# Altium footprint library MiscDevices.PcbLib: 251 footprints (part 9 of 16)
Each footprint in its own frame and in the unit in brackets; x right, y up, seen from the top. Pads: shape width x height; smd on the part's side, far side on the other; paste and mask are expansions set on the pad; w line width, h text height; cw(c..) or ccw(c..) is an arc to the next point about the centre after c.
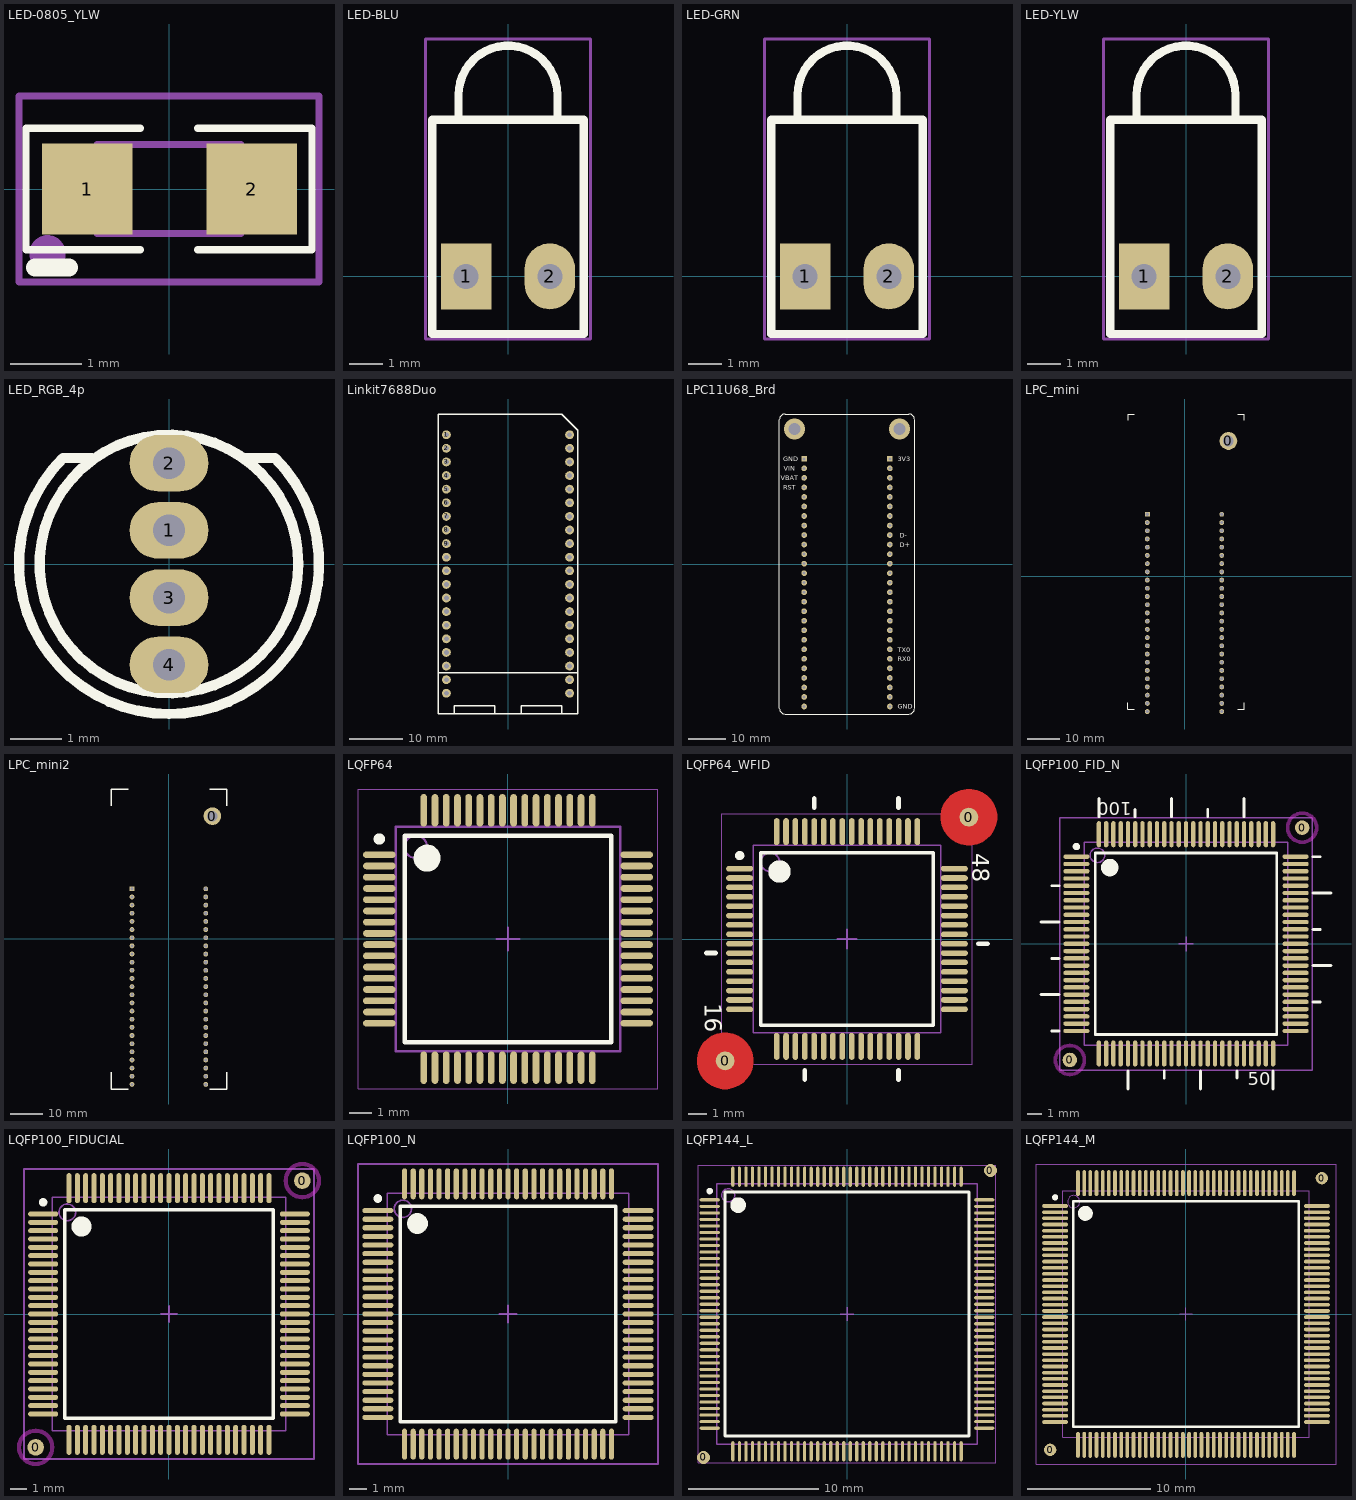
[diagram p8: the footprints below, top view; thin cyan lines are the x and y axes]

## LED-0805_YLW [mil] "Chip LED0805 ; YELLOW"
height 23.62
pads (2):
  rect 50x50 smd: 1(-45,0) 2(45.55,0)
Top Overlay:
  lines w3.94: -15.75,-33.46 -78.74,-33.46 -78.74,33.47 -15.75,33.47 ; 15.75,-33.46 78.74,-33.46 78.74,33.47 15.75,33.47
  lines w10: -73.82,-43.31 -55.12,-43.31
Top Designator (Mech7):
  text ".Designator" at -149.95,-10 h30
Top Assembly:
  lines w3.94: -39.76,-24.6 39.77,-24.6 39.77,24.61 -39.76,24.61 -39.76,-24.6
Top Courtyard:
  circle w10: c-66.93,-35.43 r5
  lines w3.94: -82.68,-51.18 82.68,-51.18 82.68,51.18 -82.68,51.18 -82.68,-51.18
3D body "User Library-User Library-led_0805 YEL.STEP": height 43.31, standoff 0, extent -39.76,-24.61 39.76,24.61

## LED-BLU [mil] "Typical INFRARED GaAs LED; 2 Leads"
pads (2):
  rect 60x78.74 hole 30: 1(-50,0)
  oval 60x78.74 hole 30: 2(50,0)
Top Overlay:
  lines w10: -59.06,187.01 -59.06,216.54 cw(c0,216.54) 59.06,216.54 59.06,187.01 ; -90.55,-68.9 90.55,-68.9 90.55,187.01 -90.55,187.01 -90.55,-68.9
Top Designator (Mech7):
  text ".Designator" at -236.14,82.68 h47.24
Top Courtyard:
  lines w3.94: -98.43,-74.8 98.43,-74.8 98.43,283.46 -98.43,283.46 -98.43,-74.8
3D body "User Library-LEDd3BL.SLDPRT": height 287.9, standoff -97.93, extent -91.79,-75 90.21,269.86

## LED-GRN [mil] "Typical INFRARED GaAs LED; 2 Leads"
pads (2):
  rect 60x78.74 hole 30: 1(-50,0)
  oval 60x78.74 hole 30: 2(50,0)
Top Overlay:
  lines w10: -59.06,187.01 -59.06,216.54 cw(c0,216.54) 59.06,216.54 59.06,187.01 ; -90.55,-68.9 -90.55,187.01 90.55,187.01 90.55,-68.9 -90.55,-68.9
Top Designator (Mech7):
  text ".Designator" at -236.14,82.68 h47.24
Top Courtyard:
  lines w3.94: -98.43,-74.8 -98.43,283.46 98.43,283.46 98.43,-74.8 -98.43,-74.8
3D body "User Library-LEDd3GC.STEP": height 287.9, standoff -97.93, extent -91,-75 91,269.43

## LED-YLW [mil] "Typical INFRARED GaAs LED; 2 Leads"
pads (2):
  rect 60x78.74 hole 30: 1(-50,0)
  oval 60x78.74 hole 30: 2(50,0)
Top Overlay:
  lines w10: -59.06,187.01 -59.06,216.54 cw(c0,216.54) 59.06,216.54 59.06,187.01 ; -90.55,-68.9 90.55,-68.9 90.55,187.01 -90.55,187.01 -90.55,-68.9
Top Designator (Mech7):
  text ".Designator" at -236.14,82.68 h47.24
Top Courtyard:
  lines w3.94: -98.43,-74.8 -98.43,283.46 98.43,283.46 98.43,-74.8 -98.43,-74.8
3D body "User Library-LEDd3YL.SLDPRT": height 287.9, standoff -97.93, extent -92.65,-74 90.45,271.44

## LED_RGB_4p [mil]
pads (4):
  oval 60x43 hole 24: 1(0,25.59) 2(0,76.77) 3(0,-25.59) 4(0,-76.77)
Top Overlay:
  circle w7.87: c0,0 r98.43
  lines w7.87: -59.06,80.73 -80.73,80.73 ccw(c0,0) 80.73,80.73 59.06,80.73
Top Designator (Mech7):
  text ".Designator" at -299.9,-19.99 h60

## Linkit7688Duo [mil] "Board Linkit7688/Linkit7688Duo 40 pin"
height 708.66
pads (40):
  round 65 hole 35: 1(-452.76,950) 2(-452.76,850) 3(-452.76,750) 4(-452.76,650) 5(-452.76,550) 6(-452.76,450) 7(-452.76,350) 8(-452.76,250) 9(-452.76,150) 10(-452.76,50) 11(-452.76,-50) 12(-452.76,-150) 13(-452.76,-250) 14(-452.76,-350) 15(-452.76,-450) 16(-452.76,-550) 17(-452.76,-650) 18(-452.76,-750) 19(-452.76,-850) 20(-452.76,-950) 21(452.76,950) 22(452.76,850) 23(452.76,750) 24(452.76,650) 25(452.76,550) 26(452.76,450) 27(452.76,350) 28(452.76,250) 29(452.76,150) 30(452.76,50) 31(452.76,-50) 32(452.76,-150) 33(452.76,-250) 34(452.76,-350) 35(452.76,-450) 36(452.76,-550) 37(452.76,-650) 38(452.76,-750) 39(452.76,-850) 40(452.76,-950)
Top Overlay:
  lines w10: -511.81,-800 511.81,-800 ; -393.7,-1102.36 -393.7,-1043.31 -98.43,-1043.31 -98.43,-1102.36 ; 98.43,-1102.36 98.43,-1043.31 393.7,-1043.31 393.7,-1102.36 ; -511.81,-1102.36 -511.81,1102.36 393.7,1102.36 511.81,984.25 511.81,-1102.36 -511.81,-1102.36
Top Designator (Mech7):
  text ".Designator" at -299.9,-19.99 h60
3D body "1x20F_HEADER.SLDPRT": height 334.65, standoff -137.8, extent -502.75,-1011.81 -402.75,1011.81
3D body "1x20F_HEADER.SLDPRT": height 334.65, standoff -137.8, extent 402.76,-1011.81 502.76,1011.81

## LPC11U68_Brd [mil]
pads (54):
  rect 60x60 hole 30: 1(-450,1103.94) 28(450,1103.94)
  round 60 hole 30: 2(-450,1003.94) 3(-450,903.94) 4(-450,803.94) 5(-450,703.94) 6(-450,603.94) 7(-450,503.94) 8(-450,403.94) 9(-450,303.94) 10(-450,203.94) 11(-450,103.94) 12(-450,3.94) 13(-450,-96.06) 14(-450,-196.06) 15(-450,-296.06) 16(-450,-396.06) 17(-450,-496.06) 18(-450,-596.06) 19(-450,-696.06) 20(-450,-796.06) 21(-450,-896.06) 22(-450,-996.06) 23(-450,-1096.06) 24(-450,-1196.06) 25(-450,-1296.06) 26(-450,-1396.06) 27(-450,-1496.06) 29(450,1003.94) 30(450,903.94) 31(450,803.94) 32(450,703.94) 33(450,603.94) 34(450,503.94) 35(450,403.94) 36(450,303.94) 37(450,203.94) 38(450,103.94) 39(450,3.94) 40(450,-96.06) 41(450,-196.06) 42(450,-296.06) 43(450,-396.06) 44(450,-496.06) 45(450,-596.06) 46(450,-696.06) 47(450,-796.06) 48(450,-896.06) 49(450,-996.06) 50(450,-1096.06) 51(450,-1196.06) 52(450,-1296.06) 53(450,-1396.06) 54(450,-1496.06)
via 551.18,1417.32 diameter 216.54 hole 129.92
via -551.18,1417.32 diameter 216.54 hole 129.92
Top Overlay:
  lines w10: -708.66,-1515.75 ccw(c-649.61,-1515.75) -649.61,-1574.8 649.61,-1574.8 ccw(c649.61,-1515.75) 708.66,-1515.75 708.66,1515.75 ccw(c649.61,1515.75) 649.61,1574.8 -649.61,1574.8 ccw(c-649.61,1515.75) -708.66,1515.75 -708.66,-1515.75
  text "D-" at 551.18,275.59 h49.21
  text "D+" at 551.18,177.17 h49.21
  text "RX0" at 531.5,-1023.62 h49.21
  text "TX0" at 531.5,-925.2 h49.21
  text "GND" at 531.5,-1520.66 h49.21
  text "3V3" at 531.5,1079.34 h49.21
  text "RST" at -669.29,779.34 h49.21
  text "VBAT" at -693.89,879.34 h49.21
  text "VIN" at -665.19,979.34 h49.21
  text "GND" at -669.29,1079.34 h49.21
Top Designator (Mech7):
  text ".Designator" at -299.9,-19.99 h60
3D body "1x27F_HEADER.SLDPRT": height 334.65, standoff -137.8, extent -500,-1534.25 -400,1165.75
3D body "1x27F_HEADER.SLDPRT": height 334.65, standoff -137.8, extent 400,-1534.25 500,1165.75

## LPC_mini [mm]
height 12
pads (52):
  round 5.5 hole 3.3: 0(13.525,41.8)
  rect 0.5x0.5 smd: 0(13.531,41.82)
  rect 1.5x1.5 hole 1: 1(-11.531,19.14)
  round 1.5 hole 1: 2(-11.531,16.6) 3(-11.531,14.06) 4(-11.531,11.52) 5(-11.531,8.98) 6(-11.531,6.44) 7(-11.531,3.9) 8(-11.531,1.36) 9(-11.531,-1.18) 10(-11.531,-3.72) 11(-11.531,-6.26) 12(-11.531,-8.8) 13(-11.531,-11.34) 14(-11.531,-13.88) 15(-11.531,-16.42) 16(-11.531,-18.96) 17(-11.531,-21.5) 18(-11.531,-24.04) 19(-11.531,-26.58) 20(-11.531,-29.12) 21(11.469,-29.12) 22(11.469,-26.58) 23(11.469,-24.04) 24(11.469,-21.5) 25(11.469,-18.96) 26(11.469,-16.42) 27(11.469,-13.88) 28(11.469,-11.34) 29(11.469,-8.8) 30(11.469,-6.26) 31(11.469,-3.72) 32(11.469,-1.18) 33(11.469,1.36) 34(11.469,3.9) 35(11.469,6.44) 36(11.469,8.98) 37(11.469,11.52) 38(11.469,14.06) 39(11.469,16.6) 40(11.469,19.14) 41(-11.531,-31.66) 42(-11.531,-34.2) 43(-11.531,-36.74) 44(-11.531,-39.28) 45(-11.531,-41.82) 46(11.469,-41.82) 47(11.469,-39.28) 48(11.469,-36.74) 49(11.469,-34.2) 50(11.469,-31.66)
Top Overlay:
  lines w0.3: -17.631,-39.06 -17.631,-41.06 -15.631,-41.06 ; -17.631,48.14 -17.631,50.14 -15.631,50.14 ; 16.469,-41.06 18.469,-41.06 18.469,-39.06 ; 16.469,50.14 18.469,50.14 18.469,48.14
Top Designator (Mech7):
  text ".Designator" at -7.198,3.301 h1.52

## LPC_mini2 [mm]
height 12
pads (52):
  round 5.5 hole 3.3: 0(13.556,38.3)
  rect 0.5x0.5 smd: 0(13.561,38.32)
  rect 1.5x1.5 hole 1: 1(-11.5,15.64)
  round 1.5 hole 1: 2(-11.5,13.1) 3(-11.5,10.56) 4(-11.5,8.02) 5(-11.5,5.48) 6(-11.5,2.94) 7(-11.5,0.4) 8(-11.5,-2.14) 9(-11.5,-4.68) 10(-11.5,-7.22) 11(-11.5,-9.76) 12(-11.5,-12.3) 13(-11.5,-14.84) 14(-11.5,-17.38) 15(-11.5,-19.92) 16(-11.5,-22.46) 17(-11.5,-25) 18(-11.5,-27.54) 19(-11.5,-30.08) 20(-11.5,-32.62) 21(11.5,-32.62) 22(11.5,-30.08) 23(11.5,-27.54) 24(11.5,-25) 25(11.5,-22.46) 26(11.5,-19.92) 27(11.5,-17.38) 28(11.5,-14.84) 29(11.5,-12.3) 30(11.5,-9.76) 31(11.5,-7.22) 32(11.5,-4.68) 33(11.5,-2.14) 34(11.5,0.4) 35(11.5,2.94) 36(11.5,5.48) 37(11.5,8.02) 38(11.5,10.56) 39(11.5,13.1) 40(11.5,15.64) 41(-11.5,-35.16) 42(-11.5,-37.7) 43(-11.5,-40.24) 44(-11.5,-42.78) 45(-11.5,-45.32) 46(11.5,-45.32) 47(11.5,-42.78) 48(11.5,-40.24) 49(11.5,-37.7) 50(11.5,-35.16)
Top Overlay:
  lines w0.4: -17.969,-41.5 -17.969,-46.75 -12.719,-46.75 ; -17.969,41.5 -17.969,46.75 -12.719,46.75 ; 12.781,-46.75 18.031,-46.75 18.031,-41.5 ; 12.781,46.75 18.031,46.75 18.031,41.5
Top Designator (Mech7):
  text ".Designator" at -7.587,-0.508 h1.52
3D body "1x25F_HEADER.SLDPRT": height 8.5, standoff -3.5, extent 10.23,-46.89 12.77,17.21
3D body "1x25F_HEADER.SLDPRT": height 8.5, standoff -3.5, extent -12.77,-46.89 -10.23,17.21

## LQFP64 [mm] "TSQFP, 64-Leads, Body 10.00x10.00mm, Pitch 0.50mm, IPC Medium Density"
height 1.6
pads (64):
  oval 1.45x0.3 smd: 1(-5.725,3.75) 2(-5.725,3.25) 3(-5.725,2.75) 4(-5.725,2.25) 5(-5.725,1.75) 6(-5.725,1.25) 7(-5.725,0.75) 8(-5.725,0.25) 9(-5.725,-0.25) 10(-5.725,-0.75) 11(-5.725,-1.25) 12(-5.725,-1.75) 13(-5.725,-2.25) 14(-5.725,-2.75) 15(-5.725,-3.25) 16(-5.725,-3.75) 33(5.725,-3.75) 34(5.725,-3.25) 35(5.725,-2.75) 36(5.725,-2.25) 37(5.725,-1.75) 38(5.725,-1.25) 39(5.725,-0.75) 40(5.725,-0.25) 41(5.725,0.25) 42(5.725,0.75) 43(5.725,1.25) 44(5.725,1.75) 45(5.725,2.25) 46(5.725,2.75) 47(5.725,3.25) 48(5.725,3.75)
  oval 0.3x1.45 smd: 17(-3.75,-5.725) 18(-3.25,-5.725) 19(-2.75,-5.725) 20(-2.25,-5.725) 21(-1.75,-5.725) 22(-1.25,-5.725) 23(-0.75,-5.725) 24(-0.25,-5.725) 25(0.25,-5.725) 26(0.75,-5.725) 27(1.25,-5.725) 28(1.75,-5.725) 29(2.25,-5.725) 30(2.75,-5.725) 31(3.25,-5.725) 32(3.75,-5.725) 49(3.75,5.725) 50(3.25,5.725) 51(2.75,5.725) 52(2.25,5.725) 53(1.75,5.725) 54(1.25,5.725) 55(0.75,5.725) 56(0.25,5.725) 57(-0.25,5.725) 58(-0.75,5.725) 59(-1.25,5.725) 60(-1.75,5.725) 61(-2.25,5.725) 62(-2.75,5.725) 63(-3.25,5.725) 64(-3.75,5.725)
Top Overlay:
  circle w0.6: c-3.6,3.6 r0.3
  circle w0.25: c-5.725,4.45 r0.125
  lines w0.2: -4.6,-4.6 4.6,-4.6 4.6,4.6 -4.6,4.6 -4.6,-4.6
Top Designator (Mech7):
  text ".Designator" at -7.618,-0.508 h1.52
Top Assembly:
  circle w0.1: c-4.1,4.1 r0.5
  lines w0.1: -5,-5 5,-5 5,5 -5,5 -5,-5
Top Courtyard:
  lines w0.05: -6.675,-6.675 6.675,-6.675 6.675,6.675 -6.675,6.675 -6.675,-6.675
  lines w0.1: -0.5,0 0.5,0 ; 0,-0.5 0,0.5
3D body "LQFP64.step": height 1.6, standoff 0, extent -6,-6 6,6

## LQFP64_WFID [mm] "TSQFP, 64-Leads, Body 10.00x10.00mm, Pitch 0.50mm, IPC Medium Density"
height 1.6
pads (66):
  round 1 smd paste-10 mask+1: 0(-6.5,-6.5) 0(6.5,6.5)
  oval 1.45x0.3 smd mask+0.076: 1(-5.725,3.75) 2(-5.725,3.25) 3(-5.725,2.75) 4(-5.725,2.25) 5(-5.725,1.75) 6(-5.725,1.25) 7(-5.725,0.75) 8(-5.725,0.25) 9(-5.725,-0.25) 10(-5.725,-0.75) 11(-5.725,-1.25) 12(-5.725,-1.75) 13(-5.725,-2.25) 14(-5.725,-2.75) 15(-5.725,-3.25) 16(-5.725,-3.75) 33(5.725,-3.75) 34(5.725,-3.25) 35(5.725,-2.75) 36(5.725,-2.25) 37(5.725,-1.75) 38(5.725,-1.25) 39(5.725,-0.75) 40(5.725,-0.25) 41(5.725,0.25) 42(5.725,0.75) 43(5.725,1.25) 44(5.725,1.75) 45(5.725,2.25) 46(5.725,2.75) 47(5.725,3.25) 48(5.725,3.75)
  oval 0.3x1.45 smd mask+0.076: 17(-3.75,-5.725) 18(-3.25,-5.725) 19(-2.75,-5.725) 20(-2.25,-5.725) 21(-1.75,-5.725) 22(-1.25,-5.725) 23(-0.75,-5.725) 24(-0.25,-5.725) 25(0.25,-5.725) 26(0.75,-5.725) 27(1.25,-5.725) 28(1.75,-5.725) 29(2.25,-5.725) 30(2.75,-5.725) 31(3.25,-5.725) 32(3.75,-5.725) 49(3.75,5.725) 50(3.25,5.725) 51(2.75,5.725) 52(2.25,5.725) 53(1.75,5.725) 54(1.25,5.725) 55(0.75,5.725) 56(0.25,5.725) 57(-0.25,5.725) 58(-0.75,5.725) 59(-1.25,5.725) 60(-1.75,5.725) 61(-2.25,5.725) 62(-2.75,5.725) 63(-3.25,5.725) 64(-3.75,5.725)
Top Layer:
  pour cut-out: -6.5,-8 -6.648,-8 -6.938,-7.942 -7.211,-7.829 -7.456,-7.665 -7.665,-7.456 -7.829,-7.211 -7.942,-6.938 -8,-6.648 -8,-6.5 -8,-6.352 -7.942,-6.062 -7.829,-5.789 -7.665,-5.544 -7.456,-5.335 -7.211,-5.171 -6.938,-5.058 -6.648,-5 -6.5,-5 -6.352,-5 -6.062,-5.058 -5.789,-5.171 -5.544,-5.335 -5.335,-5.544 -5.171,-5.789 -5.058,-6.062 -5,-6.352 -5,-6.5 -5,-6.648 -5.058,-6.938 -5.171,-7.211 -5.335,-7.456 -5.544,-7.665 -5.789,-7.829 -6.062,-7.942 -6.352,-8
  pour cut-out: 6.5,5 6.352,5 6.062,5.058 5.789,5.171 5.544,5.335 5.335,5.544 5.171,5.789 5.058,6.062 5,6.352 5,6.5 5,6.648 5.058,6.938 5.171,7.211 5.335,7.456 5.544,7.665 5.789,7.829 6.062,7.942 6.352,8 6.5,8 6.648,8 6.938,7.942 7.211,7.829 7.456,7.665 7.665,7.456 7.829,7.211 7.942,6.938 8,6.648 8,6.5 8,6.352 7.942,6.062 7.829,5.789 7.665,5.544 7.456,5.335 7.211,5.171 6.938,5.058 6.648,5
Top Overlay:
  circle w0.25: c-5.725,4.45 r0.125
  circle w0.6: c-3.6,3.6 r0.3
  lines w0.2: -4.6,-4.6 -4.6,4.6 4.6,4.6 4.6,-4.6 -4.6,-4.6
  lines w0.254: -7.5,-0.75 -7,-0.75 ; -2.25,-7.5 -2.25,-7 ; -1.75,7 -1.75,7.5 ; 2.75,-7.5 2.75,-7 ; 2.75,7 2.75,7.5 ; 7,-0.25 7.5,-0.25
  text "48" at 6.68,4.57 h0.9
  text "16" at -7.58,-3.43 h0.9
Top Designator (Mech7):
  text ".Designator" at -7.618,-0.508 h1.52
Top Assembly:
  circle w0.1: c-4.1,4.1 r0.5
  lines w0.1: -5,-5 -5,5 5,5 5,-5 -5,-5
Top Courtyard:
  lines w0.05: -6.675,-6.675 -6.675,6.675 6.675,6.675 6.675,-6.675 -6.675,-6.675
  lines w0.1: -0.5,0 0.5,0 ; 0,-0.5 0,0.5
3D body "LQFP64.step": height 1.6, standoff 0, extent -6,-6 6,6

## LQFP100_FID_N [mm] "Thin QFP, 100-Leads, Body 14x14mm, Pitch 0.5mm, IPC Medium Density"
height 1.6
pads (102):
  round 1 smd paste-10 mask+0.5: 0(-8,-8) 0(8,8)
  oval 1.8x0.3 smd: 1(-7.55,6) 2(-7.55,5.5) 3(-7.55,5) 4(-7.55,4.5) 5(-7.55,4) 6(-7.55,3.5) 7(-7.55,3) 8(-7.55,2.5) 9(-7.55,2) 10(-7.55,1.5) 11(-7.55,1) 12(-7.55,0.5) 13(-7.55,0) 14(-7.55,-0.5) 15(-7.55,-1) 16(-7.55,-1.5) 17(-7.55,-2) 18(-7.55,-2.5) 19(-7.55,-3) 20(-7.55,-3.5) 21(-7.55,-4) 22(-7.55,-4.5) 23(-7.55,-5) 24(-7.55,-5.5) 25(-7.55,-6) 51(7.55,-6) 52(7.55,-5.5) 53(7.55,-5) 54(7.55,-4.5) 55(7.55,-4) 56(7.55,-3.5) 57(7.55,-3) 58(7.55,-2.5) 59(7.55,-2) 60(7.55,-1.5) 61(7.55,-1) 62(7.55,-0.5) 63(7.55,0) 64(7.55,0.5) 65(7.55,1) 66(7.55,1.5) 67(7.55,2) 68(7.55,2.5) 69(7.55,3) 70(7.55,3.5) 71(7.55,4) 72(7.55,4.5) 73(7.55,5) 74(7.55,5.5) 75(7.55,6)
  oval 0.3x1.8 smd: 26(-6,-7.55) 27(-5.5,-7.55) 28(-5,-7.55) 29(-4.5,-7.55) 30(-4,-7.55) 31(-3.5,-7.55) 32(-3,-7.55) 33(-2.5,-7.55) 34(-2,-7.55) 35(-1.5,-7.55) 36(-1,-7.55) 37(-0.5,-7.55) 38(0,-7.55) 39(0.5,-7.55) 40(1,-7.55) 41(1.5,-7.55) 42(2,-7.55) 43(2.5,-7.55) 44(3,-7.55) 45(3.5,-7.55) 46(4,-7.55) 47(4.5,-7.55) 48(5,-7.55) 49(5.5,-7.55) 50(6,-7.55) 76(6,7.55) 77(5.5,7.55) 78(5,7.55) 79(4.5,7.55) 80(4,7.55) 81(3.5,7.55) 82(3,7.55) 83(2.5,7.55) 84(2,7.55) 85(1.5,7.55) 86(1,7.55) 87(0.5,7.55) 88(0,7.55) 89(-0.5,7.55) 90(-1,7.55) 91(-1.5,7.55) 92(-2,7.55) 93(-2.5,7.55) 94(-3,7.55) 95(-3.5,7.55) 96(-4,7.55) 97(-4.5,7.55) 98(-5,7.55) 99(-5.5,7.55) 100(-6,7.55)
Top Layer keep-out:
  lines w0.254: -7,-8 ccw(c-8,-8) -7,-8 ; 9,8 ccw(c8,8) 9,8
Top Overlay:
  circle w0.6: c-5.25,5.25 r0.3
  circle w0.254: c-7.55,6.7 r0.125
  lines w0.2: -10,-3.5 -8.75,-3.5 ; -10,1.5 -8.75,1.5 ; -9.25,-6 -8.75,-6 ; -9.25,-1 -8.75,-1 ; -9.25,4 -8.75,4 ; -6,8.75 -6,10 ; -4,-10 -4,-8.75 ; -3.5,8.75 -3.5,9.25 ; -1.5,-9.25 -1.5,-8.75 ; -1,8.75 -1,10 ; 1,-10 1,-8.75 ; 1.5,8.75 1.5,9.25 ; 3.5,-9.25 3.5,-8.75 ; 4,8.75 4,10 ; 6,-10 6,-8.75 ; 8.75,-4 9.25,-4 ; 8.75,-1.5 10,-1.5 ; 8.75,1 9.25,1 ; 8.75,3.5 10,3.5 ; 8.75,6 9.25,6 ; -6.25,-6.25 6.25,-6.25 6.25,6.25 -6.25,6.25 -6.25,-6.25
  text "50" at 4.25,-9.75 h0.91
  text "100" at -3.75,9.75 h0.91
Top Designator (Mech7):
  text ".Designator" at -7.618,-0.508 h1.52
Top Assembly:
  circle w0.1: c-6.1,6.1 r0.5
  lines w0.1: -7,-7 7,-7 7,7 -7,7 -7,-7
Top Courtyard:
  lines w0.1: -0.5,0 0.5,0 ; 0,-0.5 0,0.5 ; -8.7,-8.7 8.7,-8.7 8.7,8.7 -8.7,8.7 -8.7,-8.7
3D body "User Library-LQFP100_Grid_0_5.STEP": height 1.6, standoff 0, extent -8,-8 8,8

## LQFP100_FIDUCIAL [mm] "Thin QFP, 100-Leads, Body 14x14mm, Pitch 0.5mm, IPC Medium Density"
height 1.6
pads (102):
  round 1 smd paste-10 mask+0.5: 0(-8,-8) 0(8,8)
  oval 1.8x0.3 smd: 1(-7.55,6) 2(-7.55,5.5) 3(-7.55,5) 4(-7.55,4.5) 5(-7.55,4) 6(-7.55,3.5) 7(-7.55,3) 8(-7.55,2.5) 9(-7.55,2) 10(-7.55,1.5) 11(-7.55,1) 12(-7.55,0.5) 13(-7.55,0) 14(-7.55,-0.5) 15(-7.55,-1) 16(-7.55,-1.5) 17(-7.55,-2) 18(-7.55,-2.5) 19(-7.55,-3) 20(-7.55,-3.5) 21(-7.55,-4) 22(-7.55,-4.5) 23(-7.55,-5) 24(-7.55,-5.5) 25(-7.55,-6) 51(7.55,-6) 52(7.55,-5.5) 53(7.55,-5) 54(7.55,-4.5) 55(7.55,-4) 56(7.55,-3.5) 57(7.55,-3) 58(7.55,-2.5) 59(7.55,-2) 60(7.55,-1.5) 61(7.55,-1) 62(7.55,-0.5) 63(7.55,0) 64(7.55,0.5) 65(7.55,1) 66(7.55,1.5) 67(7.55,2) 68(7.55,2.5) 69(7.55,3) 70(7.55,3.5) 71(7.55,4) 72(7.55,4.5) 73(7.55,5) 74(7.55,5.5) 75(7.55,6)
  oval 0.3x1.8 smd: 26(-6,-7.55) 27(-5.5,-7.55) 28(-5,-7.55) 29(-4.5,-7.55) 30(-4,-7.55) 31(-3.5,-7.55) 32(-3,-7.55) 33(-2.5,-7.55) 34(-2,-7.55) 35(-1.5,-7.55) 36(-1,-7.55) 37(-0.5,-7.55) 38(0,-7.55) 39(0.5,-7.55) 40(1,-7.55) 41(1.5,-7.55) 42(2,-7.55) 43(2.5,-7.55) 44(3,-7.55) 45(3.5,-7.55) 46(4,-7.55) 47(4.5,-7.55) 48(5,-7.55) 49(5.5,-7.55) 50(6,-7.55) 76(6,7.55) 77(5.5,7.55) 78(5,7.55) 79(4.5,7.55) 80(4,7.55) 81(3.5,7.55) 82(3,7.55) 83(2.5,7.55) 84(2,7.55) 85(1.5,7.55) 86(1,7.55) 87(0.5,7.55) 88(0,7.55) 89(-0.5,7.55) 90(-1,7.55) 91(-1.5,7.55) 92(-2,7.55) 93(-2.5,7.55) 94(-3,7.55) 95(-3.5,7.55) 96(-4,7.55) 97(-4.5,7.55) 98(-5,7.55) 99(-5.5,7.55) 100(-6,7.55)
Top Layer keep-out:
  lines w0.254: -7,-8 ccw(c-8,-8) -7,-8 ; 9,8 ccw(c8,8) 9,8
Top Overlay:
  circle w0.6: c-5.25,5.25 r0.3
  circle w0.254: c-7.55,6.7 r0.125
  lines w0.2: -6.25,-6.25 6.25,-6.25 6.25,6.25 -6.25,6.25 -6.25,-6.25
Top Designator (Mech7):
  text ".Designator" at -7.617,-0.508 h1.52
Top Assembly:
  circle w0.1: c-6.1,6.1 r0.5
  lines w0.1: -7,-7 7,-7 7,7 -7,7 -7,-7
Top Courtyard:
  lines w0.1: -0.5,0 0.5,0 ; 0,-0.5 0,0.5 ; -8.7,-8.7 8.7,-8.7 8.7,8.7 -8.7,8.7 -8.7,-8.7
3D body "User Library-LQFP100_Grid_0_5.STEP": height 1.6, standoff 0, extent -8,-8 8,8

## LQFP100_N [mm] "Thin QFP, 100-Leads, Body 14x14mm, Pitch 0.5mm, IPC Medium Density"
height 1.6
pads (100):
  oval 1.8x0.3 smd: 1(-7.55,6) 2(-7.55,5.5) 3(-7.55,5) 4(-7.55,4.5) 5(-7.55,4) 6(-7.55,3.5) 7(-7.55,3) 8(-7.55,2.5) 9(-7.55,2) 10(-7.55,1.5) 11(-7.55,1) 12(-7.55,0.5) 13(-7.55,0) 14(-7.55,-0.5) 15(-7.55,-1) 16(-7.55,-1.5) 17(-7.55,-2) 18(-7.55,-2.5) 19(-7.55,-3) 20(-7.55,-3.5) 21(-7.55,-4) 22(-7.55,-4.5) 23(-7.55,-5) 24(-7.55,-5.5) 25(-7.55,-6) 51(7.55,-6) 52(7.55,-5.5) 53(7.55,-5) 54(7.55,-4.5) 55(7.55,-4) 56(7.55,-3.5) 57(7.55,-3) 58(7.55,-2.5) 59(7.55,-2) 60(7.55,-1.5) 61(7.55,-1) 62(7.55,-0.5) 63(7.55,0) 64(7.55,0.5) 65(7.55,1) 66(7.55,1.5) 67(7.55,2) 68(7.55,2.5) 69(7.55,3) 70(7.55,3.5) 71(7.55,4) 72(7.55,4.5) 73(7.55,5) 74(7.55,5.5) 75(7.55,6)
  oval 0.3x1.8 smd: 26(-6,-7.55) 27(-5.5,-7.55) 28(-5,-7.55) 29(-4.5,-7.55) 30(-4,-7.55) 31(-3.5,-7.55) 32(-3,-7.55) 33(-2.5,-7.55) 34(-2,-7.55) 35(-1.5,-7.55) 36(-1,-7.55) 37(-0.5,-7.55) 38(0,-7.55) 39(0.5,-7.55) 40(1,-7.55) 41(1.5,-7.55) 42(2,-7.55) 43(2.5,-7.55) 44(3,-7.55) 45(3.5,-7.55) 46(4,-7.55) 47(4.5,-7.55) 48(5,-7.55) 49(5.5,-7.55) 50(6,-7.55) 76(6,7.55) 77(5.5,7.55) 78(5,7.55) 79(4.5,7.55) 80(4,7.55) 81(3.5,7.55) 82(3,7.55) 83(2.5,7.55) 84(2,7.55) 85(1.5,7.55) 86(1,7.55) 87(0.5,7.55) 88(0,7.55) 89(-0.5,7.55) 90(-1,7.55) 91(-1.5,7.55) 92(-2,7.55) 93(-2.5,7.55) 94(-3,7.55) 95(-3.5,7.55) 96(-4,7.55) 97(-4.5,7.55) 98(-5,7.55) 99(-5.5,7.55) 100(-6,7.55)
Top Overlay:
  circle w0.25: c-7.55,6.7 r0.125
  circle w0.6: c-5.25,5.25 r0.3
  lines w0.2: -6.25,-6.25 -6.25,6.25 6.25,6.25 6.25,-6.25 -6.25,-6.25
Top Designator (Mech7):
  text ".Designator" at -7.618,-0.508 h1.52
Top Assembly:
  circle w0.1: c-6.1,6.1 r0.5
  lines w0.1: -7,-7 -7,7 7,7 7,-7 -7,-7
Top Courtyard:
  lines w0.1: -0.5,0 0.5,0 ; 0,-0.5 0,0.5 ; -8.7,-8.7 -8.7,8.7 8.7,8.7 8.7,-8.7 -8.7,-8.7
3D body "User Library-LQFP100_Grid_0_5.STEP": height 1.6, standoff 0, extent -8,-8 8,8

## LQFP144_L [mm] "Thin QFP, 144-Leads, Body 20x20mm, Pitch 0.5mm, IPC High Density"
height 1.6
pads (146):
  round 1 smd paste-10 mask+1: 0(-11,-11) 0(11,11)
  oval 1.55x0.25 smd: 1(-10.525,8.75) 2(-10.525,8.25) 3(-10.525,7.75) 4(-10.525,7.25) 5(-10.525,6.75) 6(-10.525,6.25) 7(-10.525,5.75) 8(-10.525,5.25) 9(-10.525,4.75) 10(-10.525,4.25) 11(-10.525,3.75) 12(-10.525,3.25) 13(-10.525,2.75) 14(-10.525,2.25) 15(-10.525,1.75) 16(-10.525,1.25) 17(-10.525,0.75) 18(-10.525,0.25) 19(-10.525,-0.25) 20(-10.525,-0.75) 21(-10.525,-1.25) 22(-10.525,-1.75) 23(-10.525,-2.25) 24(-10.525,-2.75) 25(-10.525,-3.25) 26(-10.525,-3.75) 27(-10.525,-4.25) 28(-10.525,-4.75) 29(-10.525,-5.25) 30(-10.525,-5.75) 31(-10.525,-6.25) 32(-10.525,-6.75) 33(-10.525,-7.25) 34(-10.525,-7.75) 35(-10.525,-8.25) 36(-10.525,-8.75) 73(10.525,-8.75) 74(10.525,-8.25) 75(10.525,-7.75) 76(10.525,-7.25) 77(10.525,-6.75) 78(10.525,-6.25) 79(10.525,-5.75) 80(10.525,-5.25) 81(10.525,-4.75) 82(10.525,-4.25) 83(10.525,-3.75) 84(10.525,-3.25) 85(10.525,-2.75) 86(10.525,-2.25) 87(10.525,-1.75) 88(10.525,-1.25) 89(10.525,-0.75) 90(10.525,-0.25) 91(10.525,0.25) 92(10.525,0.75) 93(10.525,1.25) 94(10.525,1.75) 95(10.525,2.25) 96(10.525,2.75) 97(10.525,3.25) 98(10.525,3.75) 99(10.525,4.25) 100(10.525,4.75) 101(10.525,5.25) 102(10.525,5.75) 103(10.525,6.25) 104(10.525,6.75) 105(10.525,7.25) 106(10.525,7.75) 107(10.525,8.25) 108(10.525,8.75)
  oval 0.25x1.55 smd: 37(-8.75,-10.525) 38(-8.25,-10.525) 39(-7.75,-10.525) 40(-7.25,-10.525) 41(-6.75,-10.525) 42(-6.25,-10.525) 43(-5.75,-10.525) 44(-5.25,-10.525) 45(-4.75,-10.525) 46(-4.25,-10.525) 47(-3.75,-10.525) 48(-3.25,-10.525) 49(-2.75,-10.525) 50(-2.25,-10.525) 51(-1.75,-10.525) 52(-1.25,-10.525) 53(-0.75,-10.525) 54(-0.25,-10.525) 55(0.25,-10.525) 56(0.75,-10.525) 57(1.25,-10.525) 58(1.75,-10.525) 59(2.25,-10.525) 60(2.75,-10.525) 61(3.25,-10.525) 62(3.75,-10.525) 63(4.25,-10.525) 64(4.75,-10.525) 65(5.25,-10.525) 66(5.75,-10.525) 67(6.25,-10.525) 68(6.75,-10.525) 69(7.25,-10.525) 70(7.75,-10.525) 71(8.25,-10.525) 72(8.75,-10.525) 109(8.75,10.525) 110(8.25,10.525) 111(7.75,10.525) 112(7.25,10.525) 113(6.75,10.525) 114(6.25,10.525) 115(5.75,10.525) 116(5.25,10.525) 117(4.75,10.525) 118(4.25,10.525) 119(3.75,10.525) 120(3.25,10.525) 121(2.75,10.525) 122(2.25,10.525) 123(1.75,10.525) 124(1.25,10.525) 125(0.75,10.525) 126(0.25,10.525) 127(-0.25,10.525) 128(-0.75,10.525) 129(-1.25,10.525) 130(-1.75,10.525) 131(-2.25,10.525) 132(-2.75,10.525) 133(-3.25,10.525) 134(-3.75,10.525) 135(-4.25,10.525) 136(-4.75,10.525) 137(-5.25,10.525) 138(-5.75,10.525) 139(-6.25,10.525) 140(-6.75,10.525) 141(-7.25,10.525) 142(-7.75,10.525) 143(-8.25,10.525) 144(-8.75,10.525)
Top Overlay:
  circle w0.6: c-8.35,8.35 r0.3
  circle w0.25: c-10.525,9.425 r0.125
  lines w0.2: -9.35,-9.35 9.35,-9.35 9.35,9.35 -9.35,9.35 -9.35,-9.35
Top Designator (Mech7):
  text ".Designator" at -7.618,-0.508 h1.52
Top Assembly:
  circle w0.1: c-9.1,9.1 r0.5
  lines w0.1: -10,-10 10,-10 10,10 -10,10 -10,-10
Top Courtyard:
  lines w0.05: -11.4,-11.4 11.4,-11.4 11.4,11.4 -11.4,11.4 -11.4,-11.4
  lines w0.1: -0.5,0 0.5,0 ; 0,-0.5 0,0.5
3D body "LQFP144-0_5.STEP": height 1.58, standoff 0.01, extent -10.886,-10.886 10.886,10.886

## LQFP144_M [mm] "Thin QFP, 144-Leads, Body 20x20mm, Pitch 0.5mm, IPC Low Density"
height 1.6
pads (146):
  round 1 smd paste-10 mask+1: 0(-11,-11) 0(11,11)
  oval 2.1x0.3 smd: 1(-10.6,8.75) 2(-10.6,8.25) 3(-10.6,7.75) 4(-10.6,7.25) 5(-10.6,6.75) 6(-10.6,6.25) 7(-10.6,5.75) 8(-10.6,5.25) 9(-10.6,4.75) 10(-10.6,4.25) 11(-10.6,3.75) 12(-10.6,3.25) 13(-10.6,2.75) 14(-10.6,2.25) 15(-10.6,1.75) 16(-10.6,1.25) 17(-10.6,0.75) 18(-10.6,0.25) 19(-10.6,-0.25) 20(-10.6,-0.75) 21(-10.6,-1.25) 22(-10.6,-1.75) 23(-10.6,-2.25) 24(-10.6,-2.75) 25(-10.6,-3.25) 26(-10.6,-3.75) 27(-10.6,-4.25) 28(-10.6,-4.75) 29(-10.6,-5.25) 30(-10.6,-5.75) 31(-10.6,-6.25) 32(-10.6,-6.75) 33(-10.6,-7.25) 34(-10.6,-7.75) 35(-10.6,-8.25) 36(-10.6,-8.75) 73(10.6,-8.75) 74(10.6,-8.25) 75(10.6,-7.75) 76(10.6,-7.25) 77(10.6,-6.75) 78(10.6,-6.25) 79(10.6,-5.75) 80(10.6,-5.25) 81(10.6,-4.75) 82(10.6,-4.25) 83(10.6,-3.75) 84(10.6,-3.25) 85(10.6,-2.75) 86(10.6,-2.25) 87(10.6,-1.75) 88(10.6,-1.25) 89(10.6,-0.75) 90(10.6,-0.25) 91(10.6,0.25) 92(10.6,0.75) 93(10.6,1.25) 94(10.6,1.75) 95(10.6,2.25) 96(10.6,2.75) 97(10.6,3.25) 98(10.6,3.75) 99(10.6,4.25) 100(10.6,4.75) 101(10.6,5.25) 102(10.6,5.75) 103(10.6,6.25) 104(10.6,6.75) 105(10.6,7.25) 106(10.6,7.75) 107(10.6,8.25) 108(10.6,8.75)
  oval 0.3x2.1 smd: 37(-8.75,-10.6) 38(-8.25,-10.6) 39(-7.75,-10.6) 40(-7.25,-10.6) 41(-6.75,-10.6) 42(-6.25,-10.6) 43(-5.75,-10.6) 44(-5.25,-10.6) 45(-4.75,-10.6) 46(-4.25,-10.6) 47(-3.75,-10.6) 48(-3.25,-10.6) 49(-2.75,-10.6) 50(-2.25,-10.6) 51(-1.75,-10.6) 52(-1.25,-10.6) 53(-0.75,-10.6) 54(-0.25,-10.6) 55(0.25,-10.6) 56(0.75,-10.6) 57(1.25,-10.6) 58(1.75,-10.6) 59(2.25,-10.6) 60(2.75,-10.6) 61(3.25,-10.6) 62(3.75,-10.6) 63(4.25,-10.6) 64(4.75,-10.6) 65(5.25,-10.6) 66(5.75,-10.6) 67(6.25,-10.6) 68(6.75,-10.6) 69(7.25,-10.6) 70(7.75,-10.6) 71(8.25,-10.6) 72(8.75,-10.6) 109(8.75,10.6) 110(8.25,10.6) 111(7.75,10.6) 112(7.25,10.6) 113(6.75,10.6) 114(6.25,10.6) 115(5.75,10.6) 116(5.25,10.6) 117(4.75,10.6) 118(4.25,10.6) 119(3.75,10.6) 120(3.25,10.6) 121(2.75,10.6) 122(2.25,10.6) 123(1.75,10.6) 124(1.25,10.6) 125(0.75,10.6) 126(0.25,10.6) 127(-0.25,10.6) 128(-0.75,10.6) 129(-1.25,10.6) 130(-1.75,10.6) 131(-2.25,10.6) 132(-2.75,10.6) 133(-3.25,10.6) 134(-3.75,10.6) 135(-4.25,10.6) 136(-4.75,10.6) 137(-5.25,10.6) 138(-5.75,10.6) 139(-6.25,10.6) 140(-6.75,10.6) 141(-7.25,10.6) 142(-7.75,10.6) 143(-8.25,10.6) 144(-8.75,10.6)
Top Overlay:
  circle w0.6: c-8.15,8.15 r0.3
  circle w0.25: c-10.6,9.45 r0.125
  lines w0.2: -9.15,-9.15 9.15,-9.15 9.15,9.15 -9.15,9.15 -9.15,-9.15
Top Designator (Mech7):
  text ".Designator" at -7.618,-0.508 h1.52
Top Assembly:
  circle w0.1: c-9.1,9.1 r0.5
  lines w0.1: -10,-10 10,-10 10,10 -10,10 -10,-10
Top Courtyard:
  lines w0.05: -12.15,-12.15 12.15,-12.15 12.15,12.15 -12.15,12.15 -12.15,-12.15
  lines w0.1: -0.5,0 0.5,0 ; 0,-0.5 0,0.5
3D body "LQFP144-0_5.STEP": height 1.58, standoff 0.01, extent -10.886,-10.886 10.886,10.886